# Altium footprint library fszhang.PcbLib: 1032 footprints (part 6 of 66)
Each footprint in its own frame and in the unit in brackets; x right, y up, seen from the top. Pads: shape width x height; smd on the part's side, far side on the other; paste and mask are expansions set on the pad; w line width, h text height; cw(c..) or ccw(c..) is an arc to the next point about the centre after c.
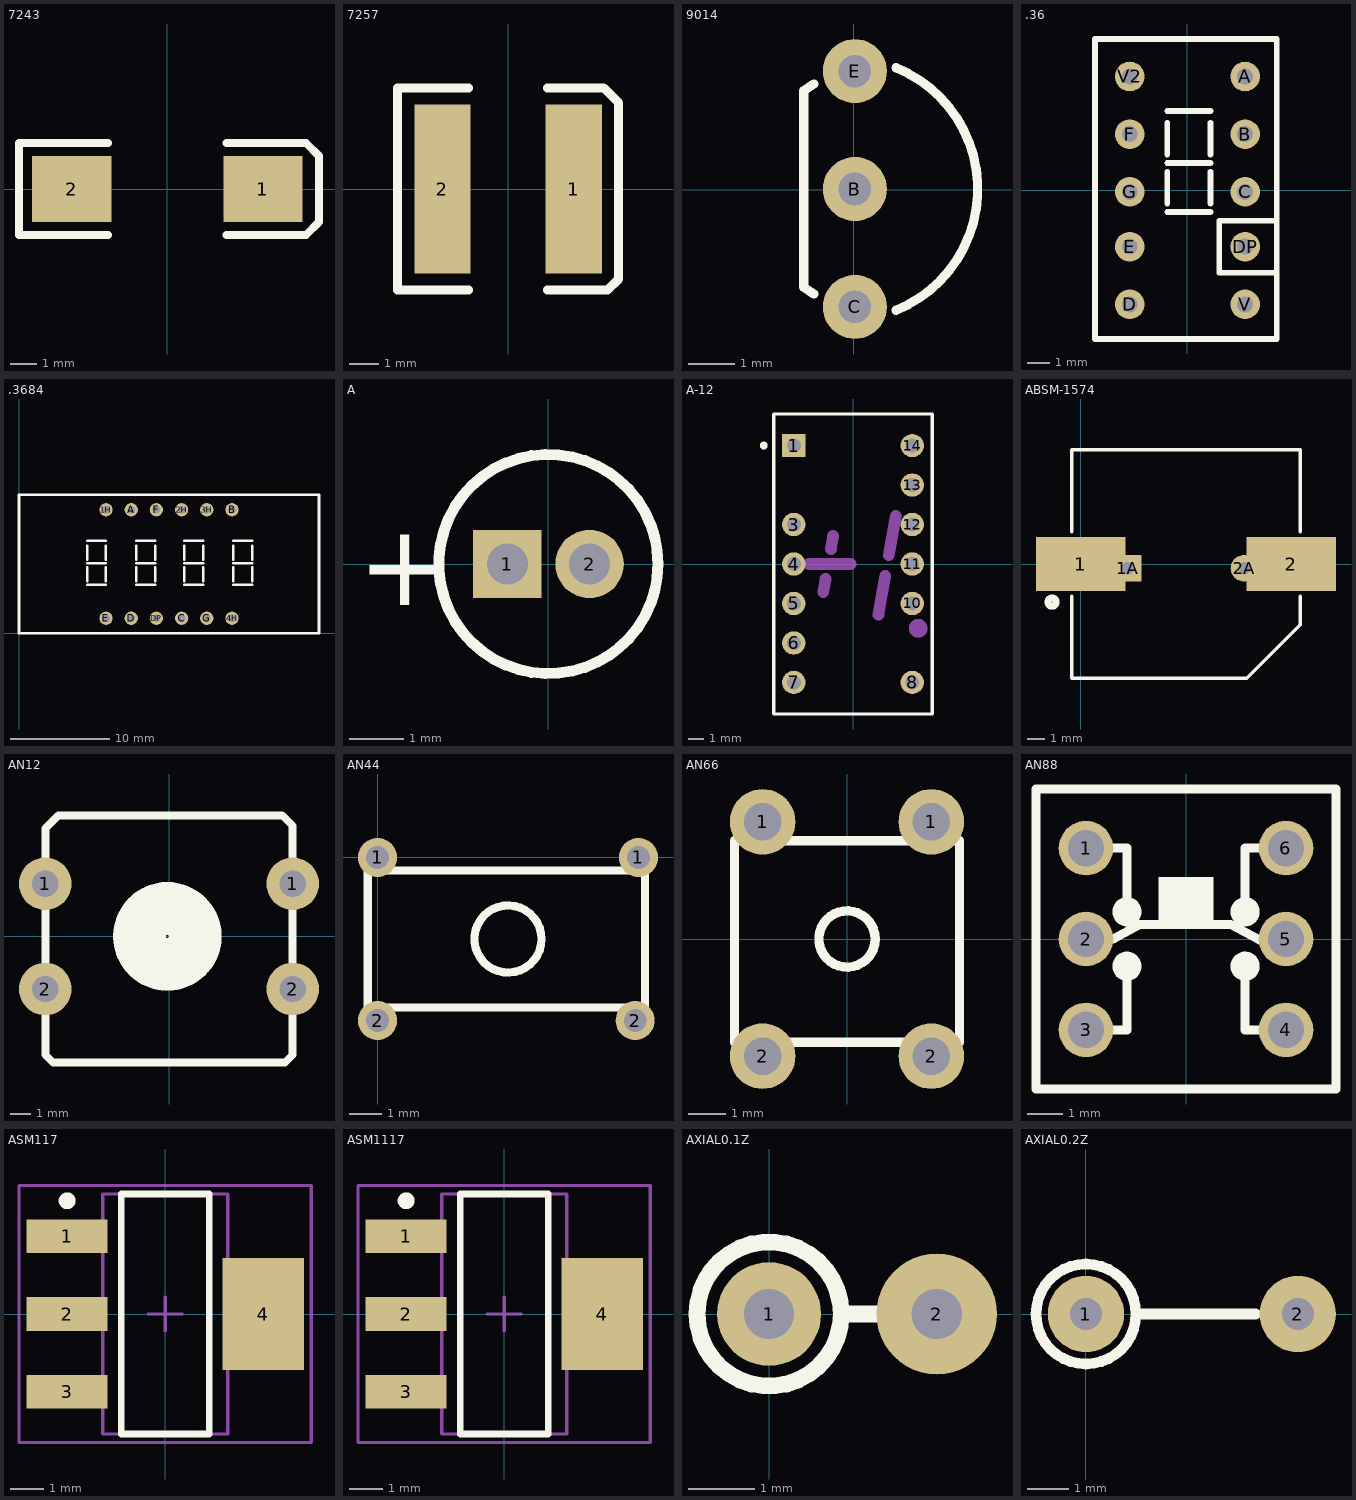
[diagram p5: the footprints below, top view; thin cyan lines are the x and y axes]

## 7243 [mil]
pads (2):
  rect 120x100 smd: 1(145,0) 2(-145,0)
Top Overlay:
  lines w12: -90,-70 -225,-70 -225,70 -90,70 ; 90,-70 210,-70 230,-50 230,50 210,70 90,70

## 7257 [mil]
pads (2):
  rect 75x225 smd: 1(87.5,0) 2(-87.5,0)
Top Overlay:
  lines w12: -52.5,-135 -147.5,-135 -147.5,135 -52.5,135 ; 52.5,-135 132.5,-135 147.5,-120 147.5,115 127.5,135 52.5,135

## 9014 [mm]
pads (3):
  round 1.38 hole 0.7: B(0.025,0.013) C(0.025,-2.527) E(0.025,2.553)
Top Overlay:
  lines w0.2: -0.856,-2.25 -1.075,-2.104 -1.075,2.129 -0.856,2.275 ; 0.911,-2.597 ccw(c-0.144,0.013) 0.911,2.623

## .36 [mm]
pads (10):
  round 1.3 hole 0.7: A(2.54,5.016) B(2.54,2.476) C(2.54,-0.064) D(-2.54,-5.016) DP(2.54,-2.476) E(-2.54,-2.476) F(-2.54,2.476) G(-2.54,-0.064) V(2.54,-5.016) V2(-2.54,5.016)
Top Overlay:
  lines w0.254: -0.889,-0.953 1.016,-0.953 ; -0.889,-0.572 -0.889,0.826 ; -0.889,1.206 1.016,1.206 ; -0.889,1.587 -0.889,2.984 ; -0.889,3.492 1.016,3.492 ; 1.016,-0.572 1.016,0.826 ; 1.016,1.587 1.016,2.984 ; 3.937,-3.619 1.397,-3.619 1.397,-1.333 3.937,-1.333 ; -4.064,-6.54 3.937,-6.54 3.937,6.667 -4.064,6.667 -4.064,-6.54

## .3684 [mil]
pads (12):
  round 52.76 hole 30: 1H(345,490) 2H(645,490) 3H(745,490) 4H(845,60) A(445,490) B(845,490) C(645,60) D(445,60) DP(545,60) E(345,60) F(545,490) G(745,60)
Top Overlay:
  lines w10: 270,192.5 345,192.5 ; 270,207.5 270,262.5 ; 270,277.5 345,277.5 ; 270,292.5 270,347.5 ; 270,367.5 345,367.5 ; 345,207.5 345,262.5 ; 345,292.5 345,347.5 ; 465,192.5 540,192.5 ; 465,207.5 465,262.5 ; 465,277.5 540,277.5 ; 465,292.5 465,347.5 ; 465,367.5 540,367.5 ; 540,207.5 540,262.5 ; 540,292.5 540,347.5 ; 655,192.5 730,192.5 ; 655,207.5 655,262.5 ; 655,277.5 730,277.5 ; 655,292.5 655,347.5 ; 655,367.5 730,367.5 ; 730,207.5 730,262.5 ; 730,292.5 730,347.5 ; 850,192.5 925,192.5 ; 850,207.5 850,262.5 ; 850,277.5 925,277.5 ; 850,292.5 850,347.5 ; 850,367.5 925,367.5 ; 925,207.5 925,262.5 ; 925,292.5 925,347.5 ; 1185,0 0,0 0,550 1185,550 ; 1190,0 1190,550

## A [mm] "Capacitor, Electrolytic, Radial; Body 4 x 5 mm (Dia.xH typ); Pin Spacing 1.5 mm (typ)"
pads (2):
  rect 1.25x1.25 hole 0.75: 1(-0.75,0)
  round 1.25 hole 0.75: 2(0.75,0)
Top Overlay:
  circle w0.2: c0,0 r2
  text "+" at -3.475,-0.75 h1.5

## A-12 [mm] "LED, Universal ? Overflow, 7.62 mm, RHD; 14 Leads (2 Absent); Row Space 7.62 mm; Pitch 2.54 mm"
height 6.35
pads (12):
  rect 1.5x1.5 hole 0.9: 1(-3.81,7.62)
  round 1.5 hole 0.9: 3(-3.81,2.54) 4(-3.81,0) 5(-3.81,-2.54) 6(-3.81,-5.08) 7(-3.81,-7.62) 8(3.81,-7.62) 10(3.81,-2.54) 11(3.81,0) 12(3.81,2.54) 13(3.81,5.08) 14(3.81,7.62)
Top Overlay:
  circle w0.25: c-5.75,7.62 r0.125
  lines w0.2: -5.1,-9.65 5.1,-9.65 5.1,9.65 -5.1,9.65 -5.1,-9.65
Mechanical 1:
  circle w0.86: c4.19,-4.139 r0.17
  lines w0.762: -2.83,0 -0.17,0 ; -1.911,-1.799 -1.764,-0.962 ; -1.427,0.961 -1.28,1.8 ; 1.63,-3.262 2.071,-0.764 ; 2.303,0.565 2.747,3.084

## ABSM-1574 [mm] "Magnetic Transducer Buzzer"
pads (4):
  rect 5x3 smd: 1(0,0) 2(11.8,0)
  rect 1.5x1.5 hole 0.7: 1A(2.65,-0.24)
  round 1.5 hole 0.7: 2A(9.15,-0.24)
Top Overlay:
  circle w0.4: c-1.6,-2.134 r0.227
  lines w0.2: -0.5,-1.8 -0.5,-6.4 9.3,-6.4 12.3,-3.4 12.3,-1.8 ; -0.5,1.8 -0.5,6.4 12.3,6.4 12.3,1.8

## AN12 [mil]
pads (4):
  round 100 hole 50: 1(-235,100) 1(235,100) 2(-235,-100) 2(235,-100)
Top Overlay:
  circle w100: c-3.15,0 r53.15
  lines w15: -235,-225 -235,205 -210,230 215,230 235,210 235,-225 220,-240 -220,-240 -235,-225

## AN44 [mm]
pads (4):
  round 1.2 hole 0.7: 1(0,0) 1(8,0) 2(0,-5) 2(7.9,-5)
Top Overlay:
  circle w0.254: c4,-2.5 r1.03
  lines w0.254: -0.3,-4.6 -0.3,-0.4 8.2,-0.4 8.2,-4.6 -0.3,-4.6

## AN66 [mil]
pads (4):
  round 70 hole 40: 1(-90,125) 1(90,125) 2(-90,-125) 2(90,-125)
Top Overlay:
  circle w10: c0,0 r30
  lines w10: -120,-110 -120,105 120,105 120,-110 -120,-110

## AN88 [mil]
pads (6):
  round 60 hole 40: 1(-110,100) 2(-110,0) 3(-110,-100) 4(110,-100) 5(110,0) 6(110,100)
Top Overlay:
  circle w18: c-65,30 r7.07
  circle w18: c65,30 r7.07
  circle w18: c65,-30 r7.07
  circle w18: c-65,-30 r7.07
  rectangle: -30,16 30,68
  lines w10: -110,-100 -65,-100 -65,-40 ; -110,0 -80,0 -51,16 49,16 81,-1 109,-1 110,0 ; -110,100 -65,100 -65,30 ; 65,-40 65,-100 110,-100 ; 65,40 65,100 110,100 ; -165,-165 -165,165 165,165 165,-165 -165,-165

## ASM117 [mm] "SOT223, 4-Leads, Body 7.1x7.3mm (max), Pitch 2.30mm, IPC Medium Density"
height 1.8
pads (4):
  rect 2.4x1 smd: 1(-2.9,2.3) 2(-2.9,0) 3(-2.9,-2.3)
  rect 2.4x3.3 smd: 4(2.9,0)
Top Overlay:
  circle w0.25: c-2.9,3.35 r0.125
  lines w0.2: -1.3,-3.55 1.3,-3.55 1.3,3.55 -1.3,3.55 -1.3,-3.55
Mechanical 13:
  lines w0.1: -1.85,-3.55 1.85,-3.55 1.85,3.55 -1.85,3.55 -1.85,-3.55
Mechanical 15:
  lines w0.1: -0.5,0 0.5,0 ; 0,-0.5 0,0.5 ; -4.325,-3.8 4.325,-3.8 4.325,3.8 -4.325,3.8 -4.325,-3.8
3D body: height 1.8, standoff 0.02, extent -1.85,-3.55 1.85,3.55

## ASM1117 [mm] "SOT223, 4-Leads, Body 7.1x7.3mm (max), Pitch 2.30mm, IPC Medium Density"
height 1.8
pads (4):
  rect 2.4x1 smd: 1(-2.9,2.3) 2(-2.9,0) 3(-2.9,-2.3)
  rect 2.4x3.3 smd: 4(2.9,0)
Top Overlay:
  circle w0.25: c-2.9,3.35 r0.125
  lines w0.2: -1.3,-3.55 1.3,-3.55 1.3,3.55 -1.3,3.55 -1.3,-3.55
Mechanical 13:
  lines w0.1: -1.85,-3.55 1.85,-3.55 1.85,3.55 -1.85,3.55 -1.85,-3.55
Mechanical 15:
  lines w0.1: -0.5,0 0.5,0 ; 0,-0.5 0,0.5 ; -4.325,-3.8 4.325,-3.8 4.325,3.8 -4.325,3.8 -4.325,-3.8
3D body: height 1.8, standoff 0.02, extent -1.85,-3.55 1.85,3.55

## AXIAL0.1Z [mil]
pads (2):
  round 62 hole 30: 1(0,0)
  round 72 hole 30: 2(100,0)
Top Overlay:
  circle w10: c0,0 r43.01
  lines w10: 45,0 70,0

## AXIAL0.2Z [mil]
pads (2):
  round 72 hole 30: 1(0,0) 2(200,0)
Top Overlay:
  circle w10: c0,0 r47.17
  lines w10: 50,0 160,0